# Altium integrated library Plytka_rozwojowa_ZCAD.IntLib: 103 symbols (part 1 of 2) (continued)
## CMP-0253-00036-2 (continued)

## CMP-0323-00203-3
designator U?, comment TPS54331D
Buck Step Down Regulator SMD  -40 to 150 degC,; Manufacturer: Texas Instruments; Regulated Outputs(#): 1; Vout(Min)(V): 0.8; Iout(Max)(A): 3; Vin(Min)(V): 3.5; Eco-Plan: Green (RoHS & no Sb/Br); Rating: Catalog; SubFamily: Step-Down Regulator; Vout(Max)(V): 25; Iq(Typ)(mA): 0.11; Vin(Max)(V): 28; Duty Cycle(Max)(%): 90; Current: 3A; Voltage: 3.5 to 28 VIN ; 0.8 to 25 VOUT; ComponentLink3Description: URL Link1; ComponentLink1URL: http://www.ti.com/general/docs/lit/getliterature.tsp?genericPartNumber=TPS54331&fileType=pdf; Code_JEDEC: MS-012AA; PartNumber: TPS54331D; PackageVersion: revM, Jun-2011; ComponentLink1Description: Datasheet; PackageReference: D0008A; PackageDescription: 8-Pin Plastic Small Outline Integrated Circuit, 4.9 x 3.9 mm, Pitch 1.27 mm Pitch; ComponentLink2URL: http://www.ti.com/litv/pdf/msoi002j; DatasheetVersion: SLVS839D; Topology: Buck; Switch Current Limit(Typ)(A): 3.5; ComponentLink3URL: Samples URL:http://www.ti.com/product/tps54331#samples; ComponentLink2Description: Package Specification; Mounting Technology: Surface Mount; Footprint: 8-Pin SOIC (D); Footprint model: https://octopart.com/tps54331d-texas+instruments-8252552?r=sp; 3D model: https://octopart.com/tps54331d-texas+instruments-8252552?r=sp; Shop link: RS Components: @6618521P; Manufacturer 1: Texas Instruments; Manufacturer Part Number 1: TPS54331D
footprint D0008A_L (SOIC, 8-Leads, Body 5x4mm, Pitch 1.27mm, IPC High Density)
footprint D0008A_M (SOIC, 8-Leads, Body 5x4mm, Pitch 1.27mm, IPC Low Density)
footprint D0008A_N (SOIC, 8-Leads, Body 5x4mm, Pitch 1.27mm, IPC Medium Density)
pins: 1 BOOT "A 0.1 uF bootstrap capacitor is required between BOOT and PH. If the voltage on this capacitor falls below the minimum requirement, the high-side MOSFET is forced to switch off until the capacitor is refreshed", 2 VIN (power) "Input supply voltage, 3.5 V to 28 V.", 3 EN (in) "Enable pin. Pull below 1.25V to disable. Float to enable. Programming the input undervoltage lockout with two resistors is recommended.", 4 SS (in) "Slow start pin. An external capacitor connected to this pin sets the output rise time.", 5 VSENSE (in) "Inverting node of the gm error amplifier.", 6 COMP "Error amplifier output, and input to the PWM comparator. Connect frequency compensation components to this pin.", 7 GND (power) "Ground", 8 PH (power) "The source of the internal high-side power MOSFET"

## CMP-0357-00072-1
designator U?, comment M25P40-VMN6P
4 Mb (x1) Serial NOR Flash Memory, 75 MHz, 2.3 to 3.6 V, 8-pin SO8 Narrow (MN), Tube; Manufacturer: Micron; Part Family: M25PÂ; Manufacturer 1: Micron Technology; Speed: 75 MHzÂ; Density: 4MbÂ; Voltage: 2.3V-3.6VÂ; PackageDescription: 8-Pin SO Narrow, 3.9 X 4.9 mm, Pitch 1.27 mm; ComponentLink2URL: http://www.micron.com/~/media/Documents/Products/Data%20Sheet/NOR%20Flash/Serial%20NOR/M25P/M25P40.pdf; Part Status: ProductionÂ; Package: SO8 NarrowÂ; RoHS: YesÂ; PackageReference: MICT-MN-8; Mounting Technology: Surface Mount; Type: Data StorageÂ; DatasheetVersion: Rev. Y; ComponentLink2Description: Datasheet; PartNumber: M25P40-VMN6P; Width: x1Â; ComponentLink1URL: http://www.micron.com/; ComponentLink3Description: Package Specification; Applications: EmbeddedÂ; ComponentLink1Description: Manufacturer URL; PackageVersion: Rev 11; ComponentLink3URL: http://www.micron.com/~/media/Documents/Products/Data%20Sheet/NOR%20Flash/Serial%20NOR/M25P/M25P05A.pdf; Manufacturer Part Number 1: M25P40-VMN6P
footprint MICT-MN-8_N (SOIC, 8-Leads, Body 5x4mm, Pitch 1.27mm, IPC Medium Density)
pins: 1 S# (in) "Chip select: When the S# input signal is HIGH, the device is deselected and DQ1 is at HIGH impedance. Unless an internal PROGRAM, ERASE, or WRITE STATUS REGISTER cycle is in progress, the device will be in the standby power (See Datasheet)", 2 DQ1 (hiz) "Serial data: The DQ1 output signal is used to transfer data serially out of the device. Data is shifted out on the falling edge of the serial clock (C).", 3 W# (in) "Write protect: The W# input signal is used to freeze the size of the area of memory that is protected against program or erase commands as specified by the values in BP2, BP1, and BP0 bits of the Status Register.", 4 VSS (power) "Ground: Reference for the VCC supply voltage.", 5 DQ0 (in) "Serial data: The DQ0 input signal is used to transfer data serially into the device. It receives commands, addresses, and the data to be programmed. Values are latched on the rising edge of the serial clock (C).", 6 C (in) "Clock: The C input signal provides the timing of the serial interface. Commands, addresses, or data present at serial data input (DQ0) is latched on the rising edge of the serial clock (C). Data on DQ1 changes after the (See Datasheet)", 7 HOLD# (in) "Hold: The HOLD# signal is used to pause any serial communications with the device without deselecting the device. During the hold condition, DQ1 is High-Z. DQ0 and C are "Don’t Care." To start the hold condition, the device (See Datasheet)", 8 VCC (power) "Device core power supply: Source voltage."

## CMP-1048-00073-1
designator Q?, comment 30C02CH-TL-E
Bipolar Transistor,, Low VCE(sat), NPN Single, 3-Pin CPH, Pb-Free, Tape and Reel; Manufacturer: On Semiconductor; IC Continuous (A): 0.7; Current: 0.7 A; Voltage: 30 V; PackageDescription: 3-Pin Small Outline Transistor, Body 2.9 x 1.6 mm, Pitch 0.95 mm; Mounting Technology: Surface Mount; ComponentLink3Description: Package Specification; ComponentLink2URL: http://www.onsemi.com/pub_link/Collateral/30C02CH-D.PDF; ComponentLink1Description: Manufacturer URL; ComponentLink2Description: Datasheet; Polarity: NPN; ComponentLink3URL: http://www.onsemi.com/pub_link/Collateral/50A02CH-D.PDF; ComponentLink1URL: http://www.onsemi.com/; PackageReference: CPH-3; RoHS: TRUE; PartNumber: 30C02CH-TL-E; Packing: Tape and Reel; Footprint: SC; Footprint model: https://octopart.com/30c02ch-tl-e-onsemi-20815499?r=sp#Specs; 3D model: https://octopart.com/30c02ch-tl-e-onsemi-20815499?r=sp#Specs; Shop link: Digi-Key: @30C02CH-TL-EOSTR-ND; Manufacturer 1: ON Semiconductor; Manufacturer Part Number 1: 30C02CH-TL-E
footprint ONSC-CPH-3_V (SOT23, 3-Leads, Body 2.9x1.6mm, Pitch 0.95mm)
pins: 1 B, 2 E, 3 C

## CMP-1048-00415-1
designator Q?, comment TME@2SA1774G  (value not drawn)
PNP Silicon General Purpose Amplifier Transistor, 3-Pin SC-75, Pb-Free, Tape and Reel; Manufacturer: On Semiconductor; IC Continuous (A): -0.1; ComponentLink2URL: http://www.onsemi.com/pub_link/Collateral/2SA1774-D.PDF; Mounting Technology: Surface Mount; PartNumber: 2SA1774G; ComponentLink2Description: Datasheet; PackageDescription: 3-Pin Small Outline Transistor, Body 1.6 x 0.8 mm, Pitch 0.5 mm; RoHS: TRUE; Packing: Tape and Reel; PackageVersion: Rev. F, 07/2005; ComponentLink1URL: http://www.onsemi.com/; ComponentLink3Description: Package Specification; ComponentLink3URL: http://www.onsemi.com/pub_link/Collateral/463-01.PDF; ComponentLink1Description: Manufacturer URL; Polarity: PNP; DatasheetVersion: Rev. 9; PackageReference: SC-75-3-463-01; ComponentLink4Description: TME; ComponentLink4URL: https://www.tme.eu/en/details/2sa1774g/pnp-smd-transistors/onsemi/; Manufacturer 1: ON Semiconductor; Manufacturer Part Number 1: 2SA1774G
footprint ONSC-SC-75-3-463-01_V (SOT23, 3-Leads, Body 1.6x0.8mm, Pitch 0.5mm)
pins: 1 B, 2 E, 3 C

## CMP-1048-00420-1
designator Q?, comment MMBT3904TT1G
General Purpose Transistor, NPN Silicon, 3-Pin SC-75, Pb-Free, Tape and Reel; Manufacturer: On Semiconductor; IC Continuous (A): 0.2; fT Min (MHz): 300; ComponentLink3URL: http://www.onsemi.com/pub_link/Collateral/463-01.PDF; DatasheetVersion: Rev. 5; RoHS: TRUE; Mounting Technology: Surface Mount; ComponentLink1URL: http://www.onsemi.com/; ComponentLink3Description: Package Specification; PackageReference: SC-75-3-463-01; Polarity: NPN; ComponentLink2Description: Datasheet; PackageVersion: Rev. F, 07/2005; PartNumber: MMBT3904TT1G; ComponentLink2URL: http://www.onsemi.cn/pub_link/Collateral/MMBT3904TT1-D.PDF; ComponentLink1Description: Manufacturer URL; PackageDescription: 3-Pin Small Outline Transistor, Body 1.6 x 0.8 mm, Pitch 0.5 mm; Packing: Tape and Reel; Manufacturer 1: ON Semiconductor; Manufacturer Part Number 1: MMBT3904TT1G
footprint ONSC-SC-75-3-463-01_V (SOT23, 3-Leads, Body 1.6x0.8mm, Pitch 0.5mm)
pins: 1 B, 2 E, 3 C

## CMP-1048-00763-1
designator Q?, comment TME@BC847ALT1G  (value not drawn)
General Purpose Transistor, NPN Silicon, 3-Pin SOT-23, Pb-Free, Tape and Reel; Manufacturer: On Semiconductor; IC Continuous (A): 0.1; fT Min (MHz): 100; Mounting Technology: Surface Mount; ComponentLink1Description: Manufacturer URL; PackageDescription: 3-Pin Small Outline Transistor, Body 2.92 x 1.3 mm, Pitch 0.95 mm; PartNumber: BC847ALT1G; PackageVersion: Rev. AP, 11/2009; ComponentLink3Description: Package Specification; DatasheetVersion: Rev. 11; ComponentLink1URL: http://www.onsemi.com/; PackageReference: SOT-23-3-318-08; ComponentLink2Description: Datasheet; Packing: Tape and Reel; Polarity: NPN; ComponentLink3URL: http://www.onsemi.cn/pub_link/Collateral/318-08.PDF; RoHS: TRUE; ComponentLink2URL: http://www.onsemi.cn/pub_link/Collateral/BC846ALT1-D.PDF; ComponentLink4Description: TME; ComponentLink4URL: https://www.tme.eu/en/details/bc847alt1g/npn-smd-transistors/onsemi/; Manufacturer 1: ON Semiconductor; Manufacturer Part Number 1: BC847ALT1G
footprint ONSC-SOT-23-3-318-08_V (SOT23, 3-Leads, Body 2.92x1.3mm, Pitch 0.95mm)
pins: 1 B, 2 E, 3 C

## CMP-1667-00003-2
designator D?, comment B340A-13-F
Diode Schottky SMA Capacitance 250mF forward Voltage 500mV; Manufacturer 1: Diodes; Peak Non-Repetitive Surge Current: 80A; Max Reverse Voltage (DC): 40V; Peak Reverse Current: 500uA; Polarity: Standard; Capacitance: 250pF; Average Rectified Current: 3A; Element Configuration: Single; Length: 4.6mm; Number of Pins: 2; Contact Plating: Tin; Min Operating Temperature: -55°C; Package Quantity: 5000; REACH SVHC: No SVHC; Voltage Rating (DC): 40V; Max Forward Surge Current (Ifsm): 80A; Forward Current: 3A; Output Current: 3A; Height: 2.3mm; Current Rating: 3A; Voltage: 40V; Max Operating Temperature: 125°C; Forward Voltage: 500mV; Packaging: Tape and Reel; Current: 3A; Termination: SMD/SMT; Radiation Hardening: No; Case/Package: SMA; Width: 2.92mm; Max Repetitive Reverse Voltage (Vrrm): 40V; Mount: Surface Mount; Weight: 0.002258oz; Lead Free: Lead Free; Footprint: SMA; Shop link: RS Components: @7384778P; Footprint model: https://octopart.com/b340a-13-f-diodes+inc.-325815?r=sp; 3D model: https://octopart.com/b340a-13-f-diodes+inc.-325815?r=sp; Manufacturer Part Number 1: B340A-13-F
footprint FP-SMA-MFG
pins: 1 C, 2 A

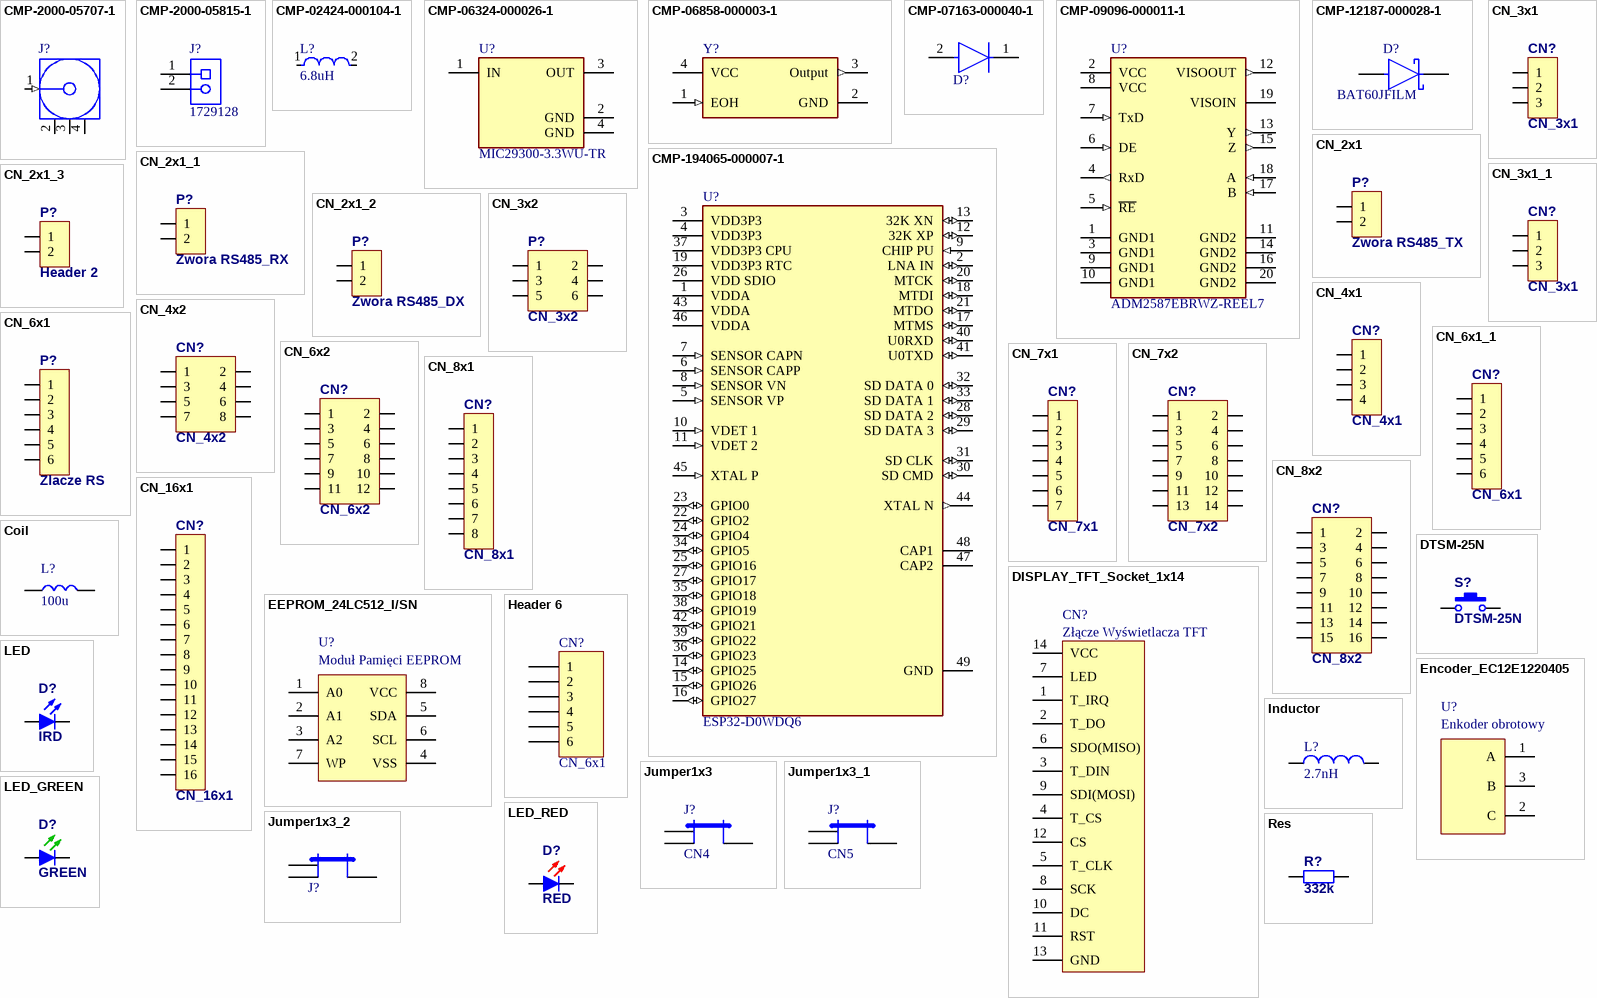
[diagram p1: symbols CMP-2000-05707-1 to Res]

## CMP-2000-05707-1
designator J?, comment TME@908-22101T  (value not drawn)
Female MMCX Connector, 1 Position, Height 3.607 mm, -40 to 90 degC, RoHS, Bulk; Manufacturer: Amphenol; Manufacturer 1: Amphenol RF; Impedance: 50Ohm; Body Material: BerylliumCopper; Shield Termination: Solder; Body Finish: Gold; Frequency - Max: 6GHz; Connector Type: Jack,FemaleSocket; Other Names: 90822101ARF1724; Dielectric Material: LiquidCrystalPolymer(LCP); Online Catalog: MMCX,MicroMate™Series; 3D Model: 908-22101.igs; Fastening Type: Snap-On; Connector Style: MMCX; Standard Package: 1; Manufacturer URL: http://www.amphenol.com/; Series: MicroMate™; Mounting Type: SurfaceMount; Housing Color: Black; Operating Temperature: -55°C~155°C; Package Reference: 908-22101; Packaging: Bulk; Voltage Rating: -; Cable Group: -; Features: -; Datasheet URL: http://www.amphenolrf.com/downloads/dl/file/id/2664/product/2399/908_22101_customer_drawing.pdf; Center Contact Material: BerylliumCopper; Package Description: Female MMCX Connector, 1 Position, Height 3.607 mm; Center Contact Plating: Gold; Category: Connectors,Interconnects; Mounting Technology: SurfaceMount; Contact Termination: Solder; Ingress Protection: -; Datasheet Version: Rev. A, 05/1997; Family: CoaxialConnectors(RF); ComponentLink1Description: TME; ComponentLink1URL: https://www.tme.eu/pl/details/908-22101t/zlacza-mcx-mmcx/amphenol-icc/; Manufacturer Part Number 1: 908-22101
footprint AMPH-908-22101_V (Connector, 4-Leads, Body 4.318x4.318mm)
pins: 1 SIGNAL (in), 2 GND (power), 3 GND (power), 4 GND (power)

## CMP-2000-05815-1
designator J?, comment 1729128
PCB Terminal Block Phoenix Contact,, 2-Pin THD, RoHS, Bulk; Package Version: 03/2015; No. of Rows: 1; Pitch: 5.08mm; No. of Positions: 2; Voltage: 400V; Current Rating: 13500mA; Current: 13.5A; Manufacturer URL: http://www.phoenixcontact.com/; Datasheet URL: https://datasheet.ciiva.com/16046/1729128-16046181.pdf; RoHS: TRUE; Package URL: https://www.phoenixcontact.com/online/portal/pi/pxc/product_detail_page/!ut/p/b1/3VdJjqNKFDxLH8AFycySyWY2ozFsEPOMMQaDOX1XedGL_1Vdm5YXJleknhSKeBkvI6EA8ncAo3AYoDhBQGco6KN7VURTdemj9us_IEKEZo_YHiPAEWEFmDGOHMORkqKYCORBZxgL7ZoaZYcbFFUZ3fqxSY6GOuxydWUuHqz1ynmMFygu583Bob0Ewr6Sd_l-5m-kAueHiB0jpRwZwe58wwtkpxtMYd_LmGcDRU02dRNEyWt6Y2ti5pSyJ_reIkzIulrqApdnbT11V5jnCKbYNCvhEM1MCpPByat_X379-iThf08CI5GfOPqfBeS3BRoBOdD55AKVv0iLwCMq-2BrzXWSGRH7pUGD9uwXQjiph3xL0DKQwdGa0JImiIOmBNOestqgwTHSSs2oOep-78apyXQBvNi8ZLaFjvjWvcaUEBu0MC6Wbe-d6mB0FAebo2lUWinqYaZs5DAYzV0RP9yitUjnGJ0iI9xhZkT42OCQNUJJhkgWINNQLP2JFP6OpMg3JCVg70jqHT0lvKOnhHf0lPuOnnLf0VPuWx6_dxwUIvwk5WMkT0kLL1mh61l2yZVSzG3pYV_bqo-mj6uMKwKwdnnW8Jh5RTOJzMOA5c-eJDaZQw4mTMPH02PvS_ZAqNVjVTo2WyYLkwH_KU1mmmG5kjRhDqPXLwwVHvVOjCM60-fpXvTDfMGW1PVFVS1r4e4yVDk4ZdNbkUHvqPqQSeian4UD39fNKmachqdJ1NJbyk8rXT9mXTvPk3oE5meulKGgiruPJek-4I9hTT6G8ZLOyRSm2RRVbThERQad5OS28hdt4YW4vG0stgYYzsWsK4_7y6DZMjJSCqri1kyiZR5vD7pwIrNR7QwPHTcLTI5qT7eRlpHrdGiupYlqQDJ7zy_CND8fWWBoLRXxk1RVcXiBQwbTD4Xi7KL-FuO94t9xaqweXzH; PartNumber: 1729128; Package Description: 2-Pin Through Hole Device, Body 8.1 x 10.16 mm, Pitch 5.08 mm; Datasheet Version: 12/2013; Mounting Technology: ThroughHole; Orientation: Horizontal; Package Reference: 1729128-2; Manufacturer: Phoenix Contact; Packing: Bulk; Footprint model: https://octopart.com/1729128-phoenix+contact-4366?r=sp; 3D model: https://octopart.com/1729128-phoenix+contact-4366?r=sp; Shop link: Digi-Key: @277-1247-ND; Manufacturer 1: Phoenix Contact; Manufacturer Part Number 1: 1729128
footprint PHOE-1729128-2_V (Receptacle, 2-Leads, Body 8.1x10.16mm, Pitch 5.08mm)
pins: 1, 2

## CMP-02424-000104-1
designator L?, comment 6.8uH
IHLP2525CZER6R8M01 Commercial Inductors, High Saturation Series 6.8uH 4.5A 60mΩ 20%; Manufacturer 1: Vishay; Saturation Current: 8A; Self Resonant Frequency: 5MHz; Core Material: Metal; DC Resistance (DCR): 60mR; Test Frequency: 100kHz; Shielding: Shielded; Number of Pins: 2; Tolerance: 20%; Max DC Current: 8A; Max Operating Temperature: 125°C; Radiation Hardening: No; Inductance: 6.8uH; Contact Plating: Tin; RMS Current (Irms): 4.5A; Case/Package: 2525; Inductance Tolerance: 20%; Case Code (Metric): 6363; Lead Free: Lead Free; Package Quantity: 2000; Current Rating: 4.5A; Case Code (Imperial): 2525; Height - Seated (Max): 0.118inch; Height: 3mm; Mount: Surface Mount; Depth: 6.72mm; Military Standard: Not; Packaging: Tape and Reel; Min Operating Temperature: -55°C; Width: 0.255inch; Length: 7.24mm; Termination: SMD/SMT; Current: 4.5A; Footprint: 2525; Shop link: Mouser: @70-IHLP2525CZER6R8M1; Footprint model: https://octopart.com/ihlp2525czer6r8m01-vishay-39619540?r=sp#CadModels; 3D model: https://octopart.com/ihlp2525czer6r8m01-vishay-39619540?r=sp#CadModels; Manufacturer Part Number 1: IHLP2525CZER6R8M01
footprint FP-IHLP-2525CZ-FP_2_413x3-MFG
pins: 1, 2

## CMP-06324-000026-1
designator U?, comment MIC29300-3.3WU-TR
IC REG LINEAR 3.3V 3A TO263-3; Manufacturer 1: Microchip; Dropout Voltage: 370mV; Number of Regulators: 1; Case/Package: TO-263-4; Lead Free: Lead Free; Min Operating Temperature: -40°C; Mount: Surface Mount; Packaging: Tape and Reel; Output Voltage: 3.3V; Max Operating Temperature: 125°C; Output Current: 3A; Shoplink: TME: @ MIC29300-3.3WU; Manufacturer Part Number 1: MIC29300-3.3WU-TR
footprint FP-TO263-3LD-PL-1-MFG
pins: 1 IN, 2 GND, 3 OUT, 4 GND

## CMP-06858-000003-1
designator Y?, comment 625L3C040M00000  (value not drawn)
XTAL OSC XO 40.0000MHZ CMOS SMD; Manufacturer 1: CTS; Max Supply Current: 15mA; Frequency: 40MHz; Frequency Stability: 50ppm; Min Supply Voltage: 2.97V; Max Supply Voltage: 3.63V; Load Capacitance: 15pF; Operating Supply Voltage: 3.3V; Min Operating Temperature: -10°C; Length: 2.5mm; Radiation Hardening: No; Max Operating Temperature: 70°C; Depth: 2mm; Mount: Surface Mount; Height: 0.039inch; Packaging: Tape and Reel; Case/Package: CSMD; Termination: SMD/SMT; Package Quantity: 3000; Contact Plating: Gold; Width: 0.079inch; Manufacturer Part Number 1: 625L3C040M00000
footprint FP-625-MFG
pins: 1 EOH (in), 2 GND (power), 3 Output (out), 4 VCC (power)

## CMP-07163-000040-1
designator D?, comment TME@1N4148WS  (value not drawn)
DIODE GEN PURP 75V 150MA SOD323F; Manufacturer 1: ON Semiconductor / Fairchild; Forward Voltage: 1V; Power Dissipation: 200mW; Element Configuration: Single; Max Forward Surge Current (Ifsm): 2A; Peak Reverse Current: 5uA; Recovery Time: 4ns; Package Quantity: 1; Number of Pins: 2; Height: 1mm; REACH SVHC: No SVHC; Max Reverse Voltage (DC): 75V; Forward Current: 150mA; Length: 1.8mm; Max Repetitive Reverse Voltage (Vrrm): 75V; Max Operating Temperature: 150°C; Average Rectified Current: 150mA; Contact Plating: Tin; Packaging: Tape and Reel; Radiation Hardening: No; Min Operating Temperature: -55°C; Width: 1.35mm; Weight: 0.0276g; Lead Free: Lead Free; Mount: Surface Mount; Reverse Voltage: 75V; Reverse Recovery Time: 4ns; ComponentLink1Description: TME; ComponentLink1URL: https://www.tme.eu/en/details/1n4148ws/smd-universal-diodes/onsemi/; Manufacturer Part Number 1: 1N4148WS
footprint FP-477AB-IPC_C
footprint FP-477AB-IPC_B
footprint FP-477AB-IPC_A
pins: 1 C, 2 A

## CMP-09096-000011-1
designator U?, comment ADM2587EBRWZ-REEL7
DGTL ISO RS422/RS485 20SOIC TME@ADM2587EBRWZ-REEL7; Manufacturer: Analog Devices; Min Supply Voltage: 3.3V; Simplex Duplex: Full Duplex; Nominal Supply Current: 72-125mA; Data Rate: 500kbits/s; Number Of Receivers: 1; Interface: RS-485,RS-422; Max Supply Voltage: 5V; Standoff Height: 0.1mm; Package: RW-20; ComponentLink2Description: Datasheet; Digikey Description: DGTL ISO RS422/RS485 20SOIC; Ipc Land Pattern Name: SOIC127P1032X250-20; Automotive: No; Octopart: https://octopart.com/adm2587ebrwz-reel7-analog+devices-12809043; Device Class L3: RS-232 / RS-422 / RS-485 Interface ICs; Temperature: -40°C to +85°C; Lead Free: Yes; ComponentLink2URL: https://www.analog.com/media/en/technical-documentation/data-sheets/adm2582e_2587e.pdf; RoHS: TRUE; Manufacturer Part Number: ADM2587EBRWZ-REEL7; Temperature Range Low: -40°C; Height: 2.65mm; Temperature Range High: +85°C; Mouser Description: Digital Isolators 2.5kV Sgnl & Pwr Iso Full/Hlf Duplx; Device Class L2: Interface ICs; Device Class L1: Integrated Circuits (ICs); Number Of Transmitters: 1; Category: IC; ComponentLink3Description: TME; ComponentLink3URL: https://www.tme.eu/pl/details/adm2587ebrwz-reel7/uklady-scalone-interfejs-rs232-422-485/analog-devices/; Manufacturer 1: Analog Devices; Manufacturer Part Number 1: ADM2587EBRWZ-REEL7
footprint FP-RW-20-IPC_C
footprint FP-RW-20-IPC_B
footprint FP-RW-20-IPC_A
pins: 1 GND1 (power), 2 VCC (power), 3 GND1 (power), 4 RxD (out), 5 ~{RE} (in), 6 DE (in), 7 TxD (in), 8 VCC (power), 9 GND1 (power), 10 GND1 (power), 11 GND2 (power), 12 VISOOUT (out), 13 Y (out), 14 GND2 (power), 15 Z (out), 16 GND2 (power), 17 B (in), 18 A (in), 19 VISOIN (power), 20 GND2 (power)

## CMP-12187-000028-1
designator D?, comment BAT60JFILM
Diode schottky RRM; Manufacturer 1: STMicroelectronics; Current: 3A; Max Forward Surge Current (Ifsm): 5A; Forward Voltage: 580mV; Max Reverse Leakage Current: 7.5uA; Element Configuration: Single; Max Reverse Voltage (DC): 10V; Polarity: Standard; Contact Plating: Tin; Package Quantity: 1; Mount: Surface Mount; Min Operating Temperature: -65°C; Average Rectified Current: 3A; Packaging: Tape and Reel; Forward Current: 3A; Height: 1.07mm; Length: 1.8mm; REACH SVHC: No SVHC; Peak Non-Repetitive Surge Current: 5A; Max Surge Current: 5A; Width: 1.45mm; Current Rating: 3A; Lead Free: Lead Free; Radiation Hardening: No; Peak Reverse Current: 7.5uA; Voltage: 10V; Max Operating Temperature: 150°C; Max Repetitive Reverse Voltage (Vrrm): 10V; Number of Pins: 2; Weight: 0.01lb; Footprint: SOD323; Footprint model: https://octopart.com/search?autosugg_idx=0&currency=USD&oq=BAT60JFILM&q=BAT60JFILM&specs=1; 3D model: https://octopart.com/search?autosugg_idx=0&currency=USD&oq=BAT60JFILM&q=BAT60JFILM&specs=1; Shop link: RS-Components: @7146879P; Manufacturer Part Number 1: BAT60JFILM
footprint FP-BAT60JFILM-MFG
footprint FP-BAT60JFILM-IPC_C
footprint FP-BAT60JFILM-IPC_B
footprint FP-BAT60JFILM-IPC_A
pins: 1 K, 2 A

## CMP-194065-000007-1
designator U?, comment ESP32-D0WDQ6
IC RF TXRX+MCU BLUETOOTH 48VFQFN; Manufacturer 1: Espressif Systems; Memory Size: 520KB; Current - Receiving: 100mA; Current - Transmitting: 240mA; Interface: I2C; Sensitivity: -98dBm; Frequency: 2.4GHz; Data Rate: 150Mbps; Number of GPIO: 34; Min Operating Temperature: -40°C; Max Operating Temperature: 125°C; Packaging: Tape and Reel; Manufacturer Part Number 1: ESP32-D0WDQ6
footprint FP-ESP32-D0WDQ6-IPC_C
footprint FP-ESP32-D0WDQ6-IPC_B
footprint FP-ESP32-D0WDQ6-IPC_A
pins: 1 VDDA (power), 2 LNA IN (io), 3 VDD3P3 (power), 4 VDD3P3 (power), 5 SENSOR VP (in), 6 SENSOR CAPP (in), 7 SENSOR CAPN (in), 8 SENSOR VN (in), 9 CHIP PU (in), 10 VDET 1 (in), 11 VDET 2 (in), 12 32K XP (io), 13 32K XN (io), 14 GPIO25 (io), 15 GPIO26 (io), 16 GPIO27 (io), 17 MTMS (io), 18 MTDI (io), 19 VDD3P3 RTC (power), 20 MTCK (io), 21 MTDO (io), 22 GPIO2 (io), 23 GPIO0 (io), 24 GPIO4 (io), 25 GPIO16 (io), 26 VDD SDIO (power), 27 GPIO17 (io), 28 SD DATA 2 (io), 29 SD DATA 3 (io), 30 SD CMD (io), 31 SD CLK (io), 32 SD DATA 0 (io), 33 SD DATA 1 (io), 34 GPIO5 (io), 35 GPIO18 (io), 36 GPIO23 (io), 37 VDD3P3 CPU (power), 38 GPIO19 (io), 39 GPIO22 (io), 40 U0RXD (io), 41 U0TXD (io), 42 GPIO21 (io), 43 VDDA (power), 44 XTAL N (out), 45 XTAL P (in), 46 VDDA (power), 47 CAP2, 48 CAP1, 49 GND (power)

## CN_2x1
designator P?, comment Zwora RS485_TX
footprint GP_2x1
footprint GP_2x1H
footprint GP_2x1H_2mm
footprint GP_2x1_2mm
pins: 1, 2

## CN_2x1_1
designator P?, comment Zwora RS485_RX
footprint GP_2x1
footprint GP_2x1H
footprint GP_2x1H_2mm
footprint GP_2x1_2mm
pins: 1, 2

## CN_2x1_2
designator P?, comment Zwora RS485_DX
footprint GP_2x1
footprint GP_2x1H
footprint GP_2x1H_2mm
footprint GP_2x1_2mm
pins: 1, 2

## CN_2x1_3
designator P?, comment Header 2
footprint GP_2x1
footprint GP_2x1H
footprint GP_2x1H_2mm
footprint GP_2x1_2mm
pins: 1, 2

## CN_3x1
designator CN?
Goldpin type: male 2.54mm
footprint GP_3x1
footprint GP_3x1H
footprint GP_3x1H_2mm
footprint GP_3x1_2mm
pins: 1, 2, 3

## CN_3x1_1
designator CN?, comment CN_3x1
footprint GP_3x1
footprint GP_3x1H
footprint GP_3x1H_2mm
footprint GP_3x1_2mm
pins: 1, 2, 3

## CN_3x2
designator P?
footprint GP_3x2
footprint GP_3x2H
footprint GP_3x2H_2mm
footprint GP_3x2_2mm
pins: 1, 2, 3, 4, 5, 6

## CN_4x1
designator CN?
footprint GP_4x1
footprint GP_4x1H
footprint GP_4x1H_2mm
footprint GP_4x1_2mm
pins: 1, 2, 3, 4

## CN_4x2
designator CN?
footprint GP_4x2
footprint GP_4x2H
footprint GP_4x2H_2mm
footprint GP_4x2_2mm
pins: 1, 2, 3, 4, 5, 6, 7, 8

## CN_6x1
designator P?, comment Zlacze RS
footprint GP_6x1H
footprint GP_6x1
footprint GP_6x1H_2mm
footprint GP_6x1_2mm
pins: 1, 2, 3, 4, 5, 6

## CN_6x1_1
designator CN?, comment CN_6x1
footprint GP_6x1H
footprint GP_6x1
footprint GP_6x1H_2mm
footprint GP_6x1_2mm
pins: 1, 2, 3, 4, 5, 6

## CN_6x2
designator CN?
footprint GP_6x2
footprint GP_6x2H
footprint GP_6x2H_2mm
footprint GP_6x2_2mm
footprint GP_6x2_2mm_SMD
pins: 1, 2, 3, 4, 5, 6, 7, 8, 9, 10, 11, 12

## CN_7x1
designator CN?
footprint GP_7x1
footprint GP_7x1H
footprint GP_7x1H_2mm
footprint GP_7x1_2mm
pins: 1, 2, 3, 4, 5, 6, 7

## CN_7x2
designator CN?
footprint GP_7x2
footprint GP_7x2H
footprint GP_7x2H_2mm
footprint GP_7x2_2mm
pins: 1, 2, 3, 4, 5, 6, 7, 8, 9, 10, 11, 12, 13, 14

## CN_8x1
designator CN?
footprint GP_8x1
footprint GP_8x1H
footprint GP_8x1H_2mm
footprint GP_8x1_2mm
pins: 1, 2, 3, 4, 5, 6, 7, 8

## CN_8x2
designator CN?
footprint GP_8x2H
footprint GP_8x2
footprint GP_8x2_2mm
footprint GP_8x2H_2mm
pins: 1, 2, 3, 4, 5, 6, 7, 8, 9, 10, 11, 12, 13, 14, 15, 16

## CN_16x1
designator CN?
footprint GP_16x1
footprint GP_16x1H
pins: 1, 2, 3, 4, 5, 6, 7, 8, 9, 10, 11, 12, 13, 14, 15, 16

## Coil
designator L?  value 100u  (hidden comment: Coil)
Model: COIL0406-0.1; Shop link: https://www.tme.eu/pl/details/coil0406-0.1/dlawiki-pionowe/ferrocore/; Voltage: *; Prefered Voltage: *; Assembly type: THT; Quantity: *; User description: *; 3D model link: *
footprint Coil_Raster_2mm
pins: 1, 2

## DISPLAY_TFT_Socket_1x14
designator CN?, comment Złącze Wyświetlacza TFT
footprint Display_TFT_Socket_1x14_Raster_2_54mm
pins: 1 T_IRQ, 2 T_DO, 3 T_DIN, 4 T_CS, 5 T_CLK, 6 SDO(MISO), 7 LED, 8 SCK, 9 SDI(MOSI), 10 DC, 11 RST, 12 CS, 13 GND, 14 VCC

## DTSM-25N
designator S?
DIPTRONICS Brown 12x12mm SMD Tactile SPST-NO Switch; Supplier 1: TME; Supplier Part Number 1: DTSM-25N-V-B
footprint DTSM-25N
pins: 1, 2

## EEPROM_24LC512_I/SN
designator U?, comment Moduł Pamięci EEPROM
Model: 24LC512-I/SN; Shop link: https://www.tme.eu/pl/details/24lc512-i_sn/pamieci-eeprom-szeregowe/microchip-technology/; Value: *; Quantity: *; Voltage: *; Assembly type: SMD; Footprint link: https://www.snapeda.com/parts/24LC512-I/SN/Microchip%20Technology/view-part/?ref=search&t=%2024LC512-I%2FSN; 3D model link: https://www.snapeda.com/parts/24LC512-I/SN/Microchip%20Technology/view-part/?ref=search&t=%2024LC512-I%2FSN
footprint SOIC127P794X203-8N
pins: 1 A0, 2 A1, 3 A2, 4 VSS, 5 SDA, 6 SCL, 7 WP, 8 VCC

## Encoder_EC12E1220405
designator U?, comment Enkoder obrotowy
Model: EC12E1220405; Shop link: https://www.tme.eu/pl/details/ec12e1220405/enkodery-inkrementalne/alps/; Footprint link: Own design; 3D model link: https://www.snapeda.com/parts/EC12E1220405/ALPS/view-part/?ref=search&t=EC12E1220405
footprint Encoder_EC12E1220405 (Enkoder obrotowy)
pins: 1 A, 2 C, 3 B

## Header 6
designator CN?, comment CN_6x1
Header, 6-Pin; LatestRevisionDate: 17-Jul-2002; LatestRevisionNote: Re-released for DXP Platform.; Publisher: Altium Limited
footprint HDR1X6 (Connector; Header; 6 Position)
signal-integrity model Connector
pins: 1, 2, 3, 4, 5, 6

## Inductor
designator L?, comment value 2.7nH  (hidden comment: TME@0402AS-2N7K-08)
0402; Code_IEC: 1005; Published: 8-Jun-2000; LatestRevisionDate: 29-May-2009; LatestRevisionNote: IPC-7351 Footprint Added.; PackageReference: 0402-A; Publisher: Altium Limited; PackageDescription: Chip Inductor; Code_JEITA: 0402; ComponentLink1Description: New link; ComponentLink1URL: https://www.tme.eu/pl/details/0402as-2n7k-08/dlawiki-smd-0402/fastron/
footprint 0402-A (Chip Inductor, Body 1.0x0.5mm, IPC High Density)
footprint INDC1608L (Chip Inductor, Body 1.6x0.8mm, IPC High Density)
footprint 2029 (Chip Inductor, Body 2.0x1.2mm, IPC High Density)
footprint 0603 (Chip Inductor, Body 0.6x0.3mm, IPC High Density)
footprint INDC3216 (Chip Inductor, Body 3.2x1.6mm, IPC High Density)
footprint INDC4532 (Chip Inductor, Body 4.5x3.2mm, IPC High Density)
simulation model INDUCTOR (Inductor)
signal-integrity model Inductor
pins: 1, 2

## Jumper1x3
designator J?, comment CN4
footprint Model Name (Footprint not found)
footprint Jumper_1x3_Raster_2_54mm
pins: 1, 2, 3 1

## Jumper1x3_1
designator J?, comment CN5
footprint Model Name (Footprint not found)
footprint Jumper_1x3_Raster_2_54mm
pins: 1, 2, 3 1

## Jumper1x3_2
designator J?, comment Zworka  (value not drawn)
footprint Model Name (Footprint not found)
footprint Jumper_1x3_Raster_2_54mm
pins: 1, 2, 3 1

## LED
designator D?, comment IRD
Typical RED, GREEN, YELLOW, AMBER GaAs LED; Published: 04-Apr-2006
footprint LED
footprint LED V (LED)
footprint LED-Polarized
footprint LED-Polarized - 3mm
footprint LED_UNI
footprint LED1206G
footprint LED1206R
footprint LED1206Y
footprint LED0805B
footprint LED0805G
footprint LED0805O
footprint LED0805R
footprint LED0805Y
footprint LED0603B
footprint LED0603R
footprint LED0603G
footprint LED0603Y
footprint LED0603O
footprint DLx2/6 (20mm BIG LAMPS)
pins: 1 A, 2 K

## LED_GREEN
designator D?, comment GREEN
GREEN LED; Published: 04-Apr-2006
footprint LED1206G
footprint LED0805G
footprint LED0603G
footprint LED3528G
footprint LED5050G
pins: 1 A, 2 K

## LED_RED
designator D?, comment RED
RED LED; Published: 04-Apr-2006
footprint LED1206R
footprint LED0805R
footprint LED0603R
footprint LED3528R
footprint LED5050R
pins: 1 A, 2 K

## Res
designator R?  value 332k
Resistor SMD  ±1%; Published: 19-Feb-2006; ComponentLink1Description: datasheet; ComponentLink2Description: supplier
footprint PWR4412-2SBR010F (BOURNS 1W 0.01R)
footprint R0402
footprint R0603
footprint R0805
footprint R1206
footprint R1210
footprint R1812 (1812 size SMD resistor)
footprint R2512 (2512 size SMD resistor)
footprint RES10.35-6.8X2.8 (Resistor, Axial; Body 6.8 x 2.8 mm (LxDia. max), Lead Dia. 0.65 mm (max))
footprint RES14.2-10.5X3.3 (Resistor, Axial; Body 10.5 x 3.3 mm (LxDia. max), Lead Dia. 0.7 mm (max))
footprint RES17.2-13.5X6.3 (Resistor, Axial; Body 13.5 x 6.3 mm (LxDia. max), Lead Dia. 0.7 mm (max))
footprint RES21.6-16.5X6.5 (Resistor, Axial; Body 16.5 x 6.5 mm (LxDia. max), Lead Dia. 0.85 mm (max))
footprint RES30.6-25.5X9 (Resistor, Axial; Body 25.5 x 9 mm (LxDia. max), Lead Dia. 0.85 mm (max))
footprint RES41.6-36.5X10.5 (Resistor, Axial; Body 36.5 x 10.5 x 10.5mm (LxWxH max), Lead Dia. 0.85 mm (max))
simulation model RES (Default semiconductor resistor)
footprint R1206_OLD
footprint 0805
pins: 1, 2
2 alternate drawings of the same symbol

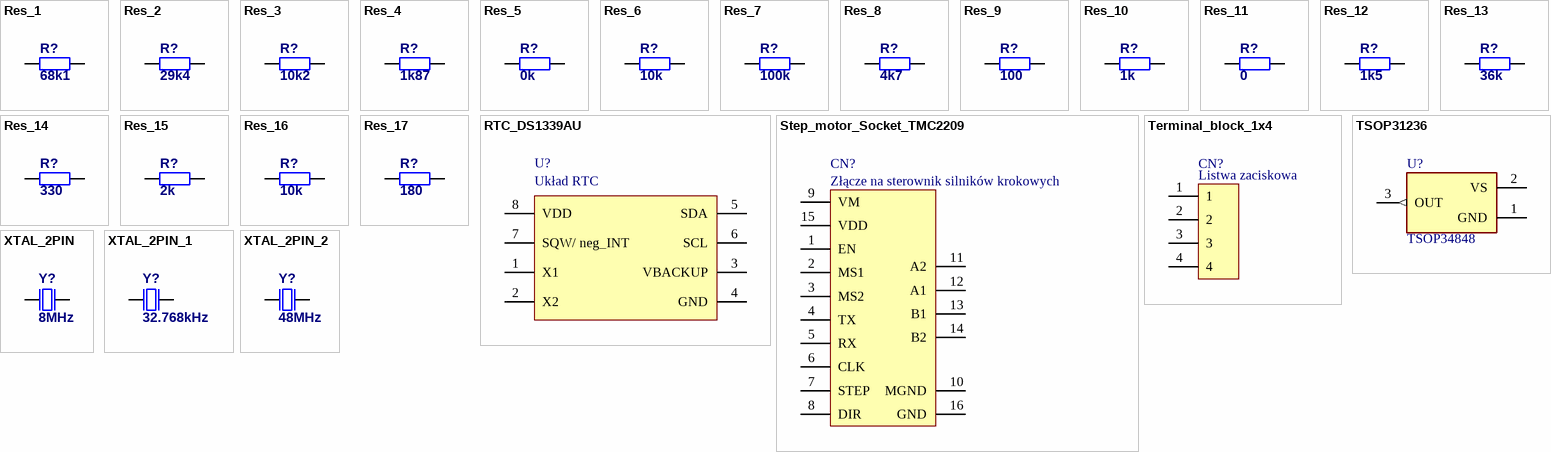
[diagram p2: symbols Res_1 to XTAL_2PIN_2]

## Res_1
designator R?  value 68k1
Resistor SMD  ±1%; Published: 19-Feb-2006; ComponentLink1Description: datasheet; ComponentLink2Description: supplier
footprint PWR4412-2SBR010F (BOURNS 1W 0.01R)
footprint R0402
footprint R0603
footprint R0805
footprint R1206
footprint R1210
footprint R1812 (1812 size SMD resistor)
footprint R2512 (2512 size SMD resistor)
footprint RES10.35-6.8X2.8 (Resistor, Axial; Body 6.8 x 2.8 mm (LxDia. max), Lead Dia. 0.65 mm (max))
footprint RES14.2-10.5X3.3 (Resistor, Axial; Body 10.5 x 3.3 mm (LxDia. max), Lead Dia. 0.7 mm (max))
footprint RES17.2-13.5X6.3 (Resistor, Axial; Body 13.5 x 6.3 mm (LxDia. max), Lead Dia. 0.7 mm (max))
footprint RES21.6-16.5X6.5 (Resistor, Axial; Body 16.5 x 6.5 mm (LxDia. max), Lead Dia. 0.85 mm (max))
footprint RES30.6-25.5X9 (Resistor, Axial; Body 25.5 x 9 mm (LxDia. max), Lead Dia. 0.85 mm (max))
footprint RES41.6-36.5X10.5 (Resistor, Axial; Body 36.5 x 10.5 x 10.5mm (LxWxH max), Lead Dia. 0.85 mm (max))
simulation model RES (Default semiconductor resistor)
footprint R1206_OLD
pins: 1, 2
2 alternate drawings of the same symbol

## Res_2
designator R?  value 29k4
Resistor SMD  ±1%; Published: 19-Feb-2006; ComponentLink1Description: datasheet; ComponentLink2Description: supplier
footprint PWR4412-2SBR010F (BOURNS 1W 0.01R)
footprint R0402
footprint R0603
footprint R0805
footprint R1206
footprint R1210
footprint R1812 (1812 size SMD resistor)
footprint R2512 (2512 size SMD resistor)
footprint RES10.35-6.8X2.8 (Resistor, Axial; Body 6.8 x 2.8 mm (LxDia. max), Lead Dia. 0.65 mm (max))
footprint RES14.2-10.5X3.3 (Resistor, Axial; Body 10.5 x 3.3 mm (LxDia. max), Lead Dia. 0.7 mm (max))
footprint RES17.2-13.5X6.3 (Resistor, Axial; Body 13.5 x 6.3 mm (LxDia. max), Lead Dia. 0.7 mm (max))
footprint RES21.6-16.5X6.5 (Resistor, Axial; Body 16.5 x 6.5 mm (LxDia. max), Lead Dia. 0.85 mm (max))
footprint RES30.6-25.5X9 (Resistor, Axial; Body 25.5 x 9 mm (LxDia. max), Lead Dia. 0.85 mm (max))
footprint RES41.6-36.5X10.5 (Resistor, Axial; Body 36.5 x 10.5 x 10.5mm (LxWxH max), Lead Dia. 0.85 mm (max))
simulation model RES (Default semiconductor resistor)
footprint R1206_OLD
pins: 1, 2
2 alternate drawings of the same symbol

## Res_3
designator R?  value 10k2
Resistor SMD  ±1%; Published: 19-Feb-2006; ComponentLink1Description: datasheet; ComponentLink2Description: supplier
footprint PWR4412-2SBR010F (BOURNS 1W 0.01R)
footprint R0402
footprint R0603
footprint R0805
footprint R1206
footprint R1210
footprint R1812 (1812 size SMD resistor)
footprint R2512 (2512 size SMD resistor)
footprint RES10.35-6.8X2.8 (Resistor, Axial; Body 6.8 x 2.8 mm (LxDia. max), Lead Dia. 0.65 mm (max))
footprint RES14.2-10.5X3.3 (Resistor, Axial; Body 10.5 x 3.3 mm (LxDia. max), Lead Dia. 0.7 mm (max))
footprint RES17.2-13.5X6.3 (Resistor, Axial; Body 13.5 x 6.3 mm (LxDia. max), Lead Dia. 0.7 mm (max))
footprint RES21.6-16.5X6.5 (Resistor, Axial; Body 16.5 x 6.5 mm (LxDia. max), Lead Dia. 0.85 mm (max))
footprint RES30.6-25.5X9 (Resistor, Axial; Body 25.5 x 9 mm (LxDia. max), Lead Dia. 0.85 mm (max))
footprint RES41.6-36.5X10.5 (Resistor, Axial; Body 36.5 x 10.5 x 10.5mm (LxWxH max), Lead Dia. 0.85 mm (max))
simulation model RES (Default semiconductor resistor)
footprint R1206_OLD
pins: 1, 2
2 alternate drawings of the same symbol

## Res_4
designator R?  value 1k87
Resistor SMD  ±1%; Published: 19-Feb-2006; ComponentLink1Description: datasheet; ComponentLink2Description: supplier
footprint PWR4412-2SBR010F (BOURNS 1W 0.01R)
footprint R0402
footprint R0603
footprint R0805
footprint R1206
footprint R1210
footprint R1812 (1812 size SMD resistor)
footprint R2512 (2512 size SMD resistor)
footprint RES10.35-6.8X2.8 (Resistor, Axial; Body 6.8 x 2.8 mm (LxDia. max), Lead Dia. 0.65 mm (max))
footprint RES14.2-10.5X3.3 (Resistor, Axial; Body 10.5 x 3.3 mm (LxDia. max), Lead Dia. 0.7 mm (max))
footprint RES17.2-13.5X6.3 (Resistor, Axial; Body 13.5 x 6.3 mm (LxDia. max), Lead Dia. 0.7 mm (max))
footprint RES21.6-16.5X6.5 (Resistor, Axial; Body 16.5 x 6.5 mm (LxDia. max), Lead Dia. 0.85 mm (max))
footprint RES30.6-25.5X9 (Resistor, Axial; Body 25.5 x 9 mm (LxDia. max), Lead Dia. 0.85 mm (max))
footprint RES41.6-36.5X10.5 (Resistor, Axial; Body 36.5 x 10.5 x 10.5mm (LxWxH max), Lead Dia. 0.85 mm (max))
simulation model RES (Default semiconductor resistor)
footprint R1206_OLD
pins: 1, 2
2 alternate drawings of the same symbol

## Res_5
designator R?  value 0k
Resistor SMD  ±5%; Published: 19-Feb-2006; ComponentLink1Description: datasheet; ComponentLink2Description: supplier
footprint PWR4412-2SBR010F (BOURNS 1W 0.01R)
footprint R0402
footprint R0603
footprint R0805
footprint R1206
footprint R1210
footprint R1812 (1812 size SMD resistor)
footprint R2512 (2512 size SMD resistor)
footprint RES10.35-6.8X2.8 (Resistor, Axial; Body 6.8 x 2.8 mm (LxDia. max), Lead Dia. 0.65 mm (max))
footprint RES14.2-10.5X3.3 (Resistor, Axial; Body 10.5 x 3.3 mm (LxDia. max), Lead Dia. 0.7 mm (max))
footprint RES17.2-13.5X6.3 (Resistor, Axial; Body 13.5 x 6.3 mm (LxDia. max), Lead Dia. 0.7 mm (max))
footprint RES21.6-16.5X6.5 (Resistor, Axial; Body 16.5 x 6.5 mm (LxDia. max), Lead Dia. 0.85 mm (max))
footprint RES30.6-25.5X9 (Resistor, Axial; Body 25.5 x 9 mm (LxDia. max), Lead Dia. 0.85 mm (max))
footprint RES41.6-36.5X10.5 (Resistor, Axial; Body 36.5 x 10.5 x 10.5mm (LxWxH max), Lead Dia. 0.85 mm (max))
simulation model RES (Default semiconductor resistor)
footprint R1206_OLD
pins: 1, 2
2 alternate drawings of the same symbol

## Res_6
designator R?, comment 10k
Resistor SMD  ±5%; Published: 19-Feb-2006; ComponentLink1Description: datasheet; ComponentLink2Description: supplier; Value: 10k
footprint PWR4412-2SBR010F (BOURNS 1W 0.01R)
footprint R0402
footprint R0603
footprint R0805
footprint R1206
footprint R1210
footprint R1812 (1812 size SMD resistor)
footprint R2512 (2512 size SMD resistor)
footprint RES10.35-6.8X2.8 (Resistor, Axial; Body 6.8 x 2.8 mm (LxDia. max), Lead Dia. 0.65 mm (max))
footprint RES14.2-10.5X3.3 (Resistor, Axial; Body 10.5 x 3.3 mm (LxDia. max), Lead Dia. 0.7 mm (max))
footprint RES17.2-13.5X6.3 (Resistor, Axial; Body 13.5 x 6.3 mm (LxDia. max), Lead Dia. 0.7 mm (max))
footprint RES21.6-16.5X6.5 (Resistor, Axial; Body 16.5 x 6.5 mm (LxDia. max), Lead Dia. 0.85 mm (max))
footprint RES30.6-25.5X9 (Resistor, Axial; Body 25.5 x 9 mm (LxDia. max), Lead Dia. 0.85 mm (max))
footprint RES41.6-36.5X10.5 (Resistor, Axial; Body 36.5 x 10.5 x 10.5mm (LxWxH max), Lead Dia. 0.85 mm (max))
simulation model RES (Default semiconductor resistor)
footprint R1206_OLD
pins: 1, 2
2 alternate drawings of the same symbol

## Res_7
designator R?, comment 100k
Resistor SMD  ±5%; Published: 19-Feb-2006; ComponentLink1Description: datasheet; ComponentLink2Description: supplier; Value: 100k
footprint PWR4412-2SBR010F (BOURNS 1W 0.01R)
footprint R0402
footprint R0603
footprint R0805
footprint R1206
footprint R1210
footprint R1812 (1812 size SMD resistor)
footprint R2512 (2512 size SMD resistor)
footprint RES10.35-6.8X2.8 (Resistor, Axial; Body 6.8 x 2.8 mm (LxDia. max), Lead Dia. 0.65 mm (max))
footprint RES14.2-10.5X3.3 (Resistor, Axial; Body 10.5 x 3.3 mm (LxDia. max), Lead Dia. 0.7 mm (max))
footprint RES17.2-13.5X6.3 (Resistor, Axial; Body 13.5 x 6.3 mm (LxDia. max), Lead Dia. 0.7 mm (max))
footprint RES21.6-16.5X6.5 (Resistor, Axial; Body 16.5 x 6.5 mm (LxDia. max), Lead Dia. 0.85 mm (max))
footprint RES30.6-25.5X9 (Resistor, Axial; Body 25.5 x 9 mm (LxDia. max), Lead Dia. 0.85 mm (max))
footprint RES41.6-36.5X10.5 (Resistor, Axial; Body 36.5 x 10.5 x 10.5mm (LxWxH max), Lead Dia. 0.85 mm (max))
simulation model RES (Default semiconductor resistor)
footprint R1206_OLD
pins: 1, 2
2 alternate drawings of the same symbol

## Res_8
designator R?, comment 4k7
Resistor SMD  ±5%; Published: 19-Feb-2006; ComponentLink1Description: datasheet; ComponentLink2Description: supplier; Value: 4k7
footprint PWR4412-2SBR010F (BOURNS 1W 0.01R)
footprint R0402
footprint R0603
footprint R0805
footprint R1206
footprint R1210
footprint R1812 (1812 size SMD resistor)
footprint R2512 (2512 size SMD resistor)
footprint RES10.35-6.8X2.8 (Resistor, Axial; Body 6.8 x 2.8 mm (LxDia. max), Lead Dia. 0.65 mm (max))
footprint RES14.2-10.5X3.3 (Resistor, Axial; Body 10.5 x 3.3 mm (LxDia. max), Lead Dia. 0.7 mm (max))
footprint RES17.2-13.5X6.3 (Resistor, Axial; Body 13.5 x 6.3 mm (LxDia. max), Lead Dia. 0.7 mm (max))
footprint RES21.6-16.5X6.5 (Resistor, Axial; Body 16.5 x 6.5 mm (LxDia. max), Lead Dia. 0.85 mm (max))
footprint RES30.6-25.5X9 (Resistor, Axial; Body 25.5 x 9 mm (LxDia. max), Lead Dia. 0.85 mm (max))
footprint RES41.6-36.5X10.5 (Resistor, Axial; Body 36.5 x 10.5 x 10.5mm (LxWxH max), Lead Dia. 0.85 mm (max))
simulation model RES (Default semiconductor resistor)
footprint R1206_OLD
pins: 1, 2
2 alternate drawings of the same symbol